# Altium footprint library Item_pcb.PcbLib: 282 footprints (part 16 of 18)
Each footprint in its own frame and in the unit in brackets; x right, y up, seen from the top. Pads: shape width x height; smd on the part's side, far side on the other; paste and mask are expansions set on the pad; w line width, h text height; cw(c..) or ccw(c..) is an arc to the next point about the centre after c.
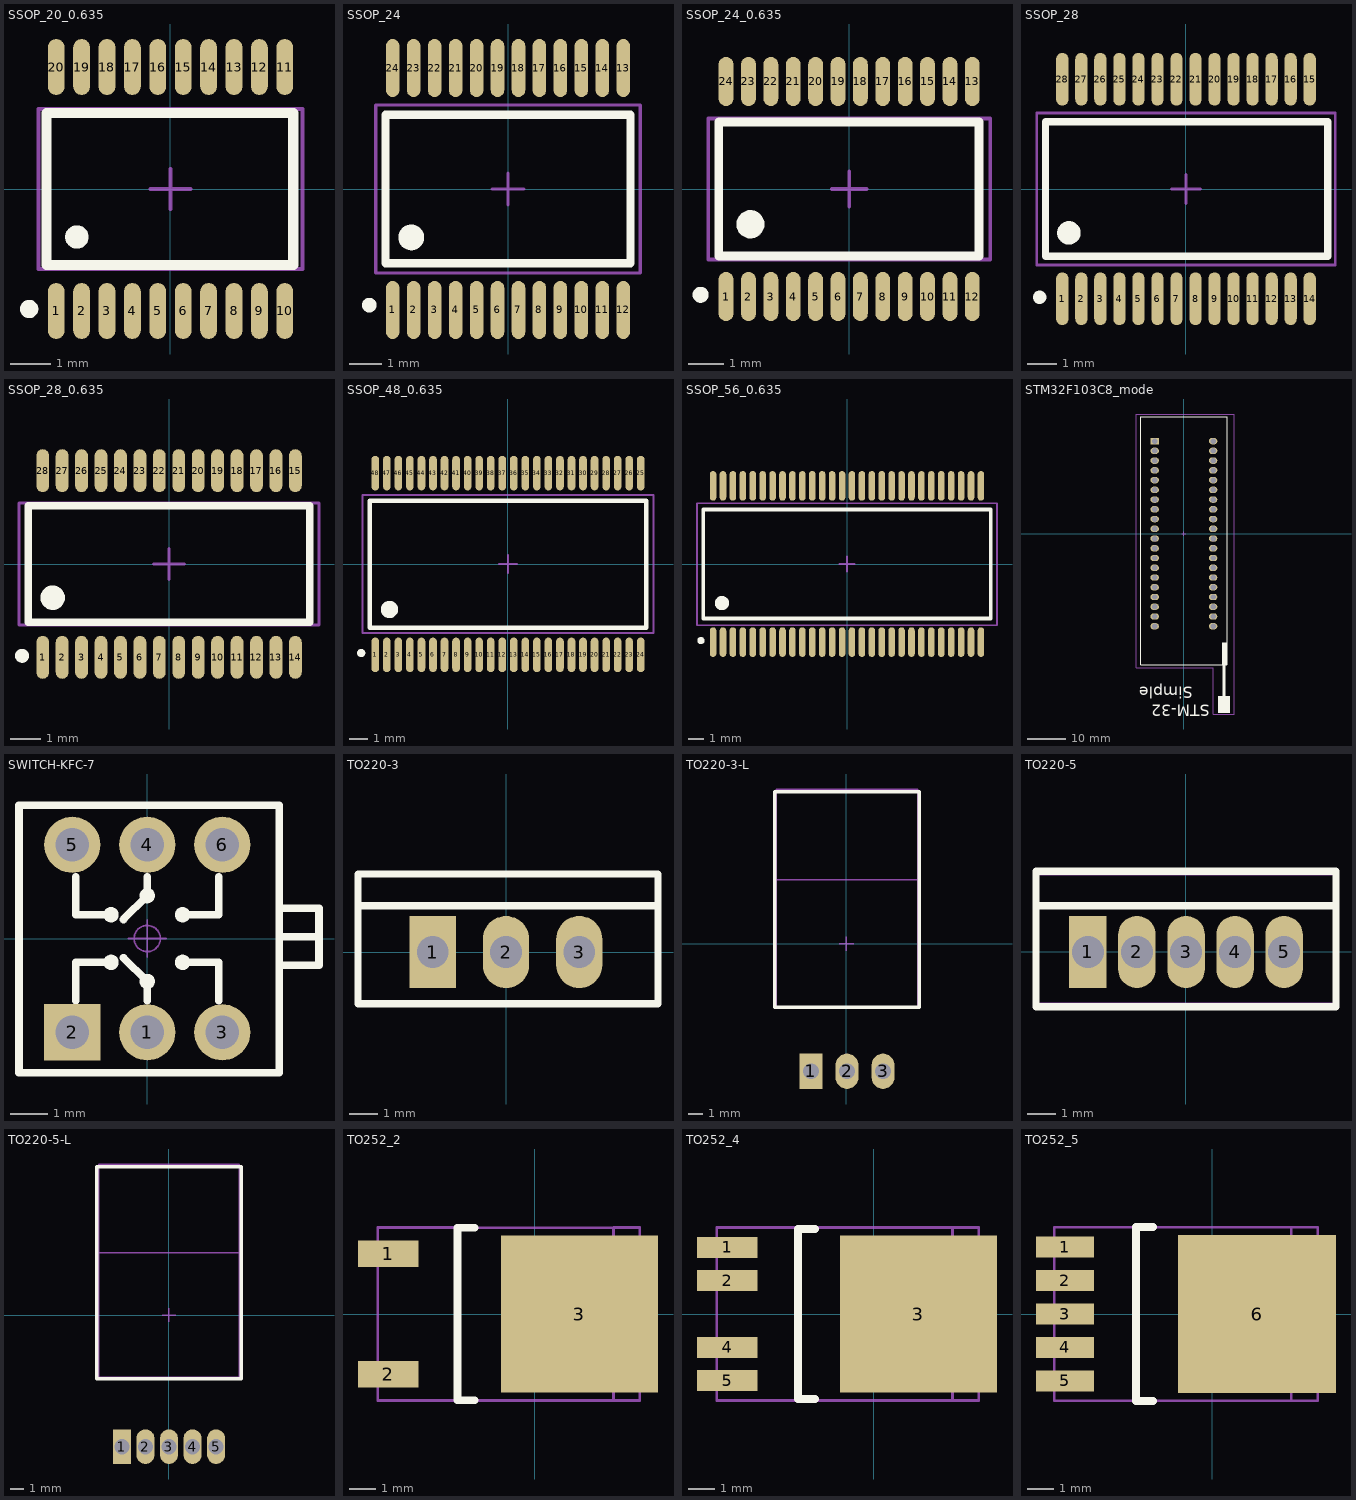
[diagram p15: the footprints below, top view; thin cyan lines are the x and y axes]

## SSOP_20_0.635 [mm]
pads (20):
  oval 0.42x1.4 smd: 1(-2.857,-3.05) 2(-2.222,-3.05) 3(-1.587,-3.05) 4(-0.953,-3.05) 5(-0.318,-3.05) 6(0.318,-3.05) 7(0.953,-3.05) 8(1.587,-3.05) 9(2.222,-3.05) 10(2.857,-3.05) 11(2.857,3.05) 12(2.222,3.05) 13(1.587,3.05) 14(0.953,3.05) 15(0.318,3.05) 16(-0.318,3.05) 17(-0.953,3.05) 18(-1.587,3.05) 19(-2.222,3.05) 20(-2.857,3.05)
Top Overlay:
  circle w0.254: c-3.532,-3 r0.1
  circle w0.3: c-2.341,-1.2 r0.141
  lines w0.254: -3.1,-1.9 -3.1,1.9 3.067,1.9 3.067,-1.9 -3.1,-1.9
Mechanical 15:
  lines w0.1: -0.5,0 0.5,0 ; 0,-0.5 0,0.5 ; -3.3,-2 -3.3,2 3.3,2 3.3,-2 -3.3,-2
3D body "TSSOP-20.STEP": height 1.2, standoff 0, extent -3.25,-3.2 3.25,3.2

## SSOP_24 [mm] "0.65"
pads (24):
  oval 0.42x1.8 smd: 1(-3.575,-3.75) 2(-2.925,-3.75) 3(-2.275,-3.75) 4(-1.625,-3.75) 5(-0.975,-3.75) 6(-0.325,-3.75) 7(0.325,-3.75) 8(0.975,-3.75) 9(1.625,-3.75) 10(2.275,-3.75) 11(2.925,-3.75) 12(3.575,-3.75) 13(3.575,3.75) 14(2.925,3.75) 15(2.275,3.75) 16(1.625,3.75) 17(0.975,3.75) 18(0.325,3.75) 19(-0.325,3.75) 20(-0.975,3.75) 21(-1.625,3.75) 22(-2.275,3.75) 23(-2.925,3.75) 24(-3.575,3.75)
Top Overlay:
  circle w0.4: c-3,-1.5 r0.2
  circle w0.254: c-4.3,-3.6 r0.1
  lines w0.254: -3.8,-2.3 -3.8,2.3 3.8,2.3 3.8,-2.3 -3.8,-2.3
Mechanical 15:
  lines w0.1: -0.5,0 0.5,0 ; 0,-0.5 0,0.5 ; -4.1,-2.6 -4.1,2.6 4.1,2.6 4.1,-2.6 -4.1,-2.6
3D body "SSOP-24.STEP": height 1.9, standoff 0, extent -4.1,-3.9 4.1,3.9

## SSOP_24_0.635 [mm]
pads (24):
  oval 0.42x1.4 smd: 1(-3.492,-3.05) 2(-2.857,-3.05) 3(-2.222,-3.05) 4(-1.587,-3.05) 5(-0.952,-3.05) 6(-0.317,-3.05) 7(0.318,-3.05) 8(0.953,-3.05) 9(1.588,-3.05) 10(2.223,-3.05) 11(2.858,-3.05) 12(3.493,-3.05) 13(3.493,3.05) 14(2.858,3.05) 15(2.223,3.05) 16(1.588,3.05) 17(0.953,3.05) 18(0.318,3.05) 19(-0.317,3.05) 20(-0.952,3.05) 21(-1.587,3.05) 22(-2.222,3.05) 23(-2.857,3.05) 24(-3.492,3.05)
Top Overlay:
  circle w0.4: c-2.8,-1 r0.2
  circle w0.254: c-4.217,-3 r0.1
  lines w0.254: -3.7,-1.9 3.683,-1.9 3.683,1.9 -3.7,1.9 -3.7,-1.9
Mechanical 15:
  lines w0.1: -0.5,0 0.5,0 ; 0,-0.5 0,0.5 ; -4,-2 4,-2 4,2 -4,2 -4,-2
3D body "TSSOP-24.STEP": height 1.2, standoff 0, extent -3.9,-3.2 3.9,3.2

## SSOP_28 [mm] "0.65"
pads (28):
  oval 0.42x1.8 smd: 1(-4.225,-3.75) 2(-3.575,-3.75) 3(-2.925,-3.75) 4(-2.275,-3.75) 5(-1.625,-3.75) 6(-0.975,-3.75) 7(-0.325,-3.75) 8(0.325,-3.75) 9(0.975,-3.75) 10(1.625,-3.75) 11(2.275,-3.75) 12(2.925,-3.75) 13(3.575,-3.75) 14(4.225,-3.75) 15(4.225,3.75) 16(3.575,3.75) 17(2.925,3.75) 18(2.275,3.75) 19(1.625,3.75) 20(0.975,3.75) 21(0.325,3.75) 22(-0.325,3.75) 23(-0.975,3.75) 24(-1.625,3.75) 25(-2.275,3.75) 26(-2.925,3.75) 27(-3.575,3.75) 28(-4.225,3.75)
Top Overlay:
  circle w0.4: c-4,-1.5 r0.2
  circle w0.254: c-5,-3.7 r0.1
  lines w0.254: -4.8,-2.3 -4.8,2.3 4.842,2.3 4.842,-2.3 -4.8,-2.3
Mechanical 15:
  lines w0.1: -0.5,0 0.5,0 ; 0,-0.5 0,0.5 ; -5.1,-2.6 -5.1,2.6 5.1,2.6 5.1,-2.6 -5.1,-2.6
3D body "User Library-SSOP-28-3.STEP": height 1.9, standoff 0, extent -5.1,-3.9 5.1,3.9

## SSOP_28_0.635 [mm]
pads (28):
  oval 0.42x1.4 smd: 1(-4.127,-3.05) 2(-3.492,-3.05) 3(-2.857,-3.05) 4(-2.222,-3.05) 5(-1.587,-3.05) 6(-0.953,-3.05) 7(-0.318,-3.05) 8(0.318,-3.05) 9(0.953,-3.05) 10(1.587,-3.05) 11(2.222,-3.05) 12(2.857,-3.05) 13(3.492,-3.05) 14(4.127,-3.05) 15(4.127,3.05) 16(3.492,3.05) 17(2.857,3.05) 18(2.222,3.05) 19(1.587,3.05) 20(0.953,3.05) 21(0.318,3.05) 22(-0.318,3.05) 23(-0.953,3.05) 24(-1.587,3.05) 25(-2.222,3.05) 26(-2.857,3.05) 27(-3.492,3.05) 28(-4.127,3.05)
Top Overlay:
  circle w0.254: c-4.802,-3 r0.1
  circle w0.4: c-3.8,-1.1 r0.2
  lines w0.254: -4.6,-1.9 -4.6,1.9 4.598,1.9 4.598,-1.9 -4.6,-1.9
Mechanical 15:
  lines w0.1: -0.5,0 0.5,0 ; 0,-0.5 0,0.5 ; -4.9,-2 -4.9,2 4.9,2 4.9,-2 -4.9,-2
3D body "TSSOP-28.STEP": height 1.2, standoff 0, extent -4.85,-3.2 4.85,3.2

## SSOP_48_0.635 [mm] "0.635"
pads (48):
  oval 0.42x1.9 smd: 1(-7.302,-5) 2(-6.667,-5) 3(-6.032,-5) 4(-5.397,-5) 5(-4.762,-5) 6(-4.127,-5) 7(-3.492,-5) 8(-2.857,-5) 9(-2.222,-5) 10(-1.587,-5) 11(-0.952,-5) 12(-0.317,-5) 13(0.318,-5) 14(0.953,-5) 15(1.588,-5) 16(2.223,-5) 17(2.858,-5) 18(3.493,-5) 19(4.128,-5) 20(4.763,-5) 21(5.398,-5) 22(6.033,-5) 23(6.668,-5) 24(7.303,-5) 25(7.303,5) 26(6.668,5) 27(6.033,5) 28(5.398,5) 29(4.763,5) 30(4.128,5) 31(3.493,5) 32(2.858,5) 33(2.223,5) 34(1.588,5) 35(0.953,5) 36(0.318,5) 37(-0.317,5) 38(-0.952,5) 39(-1.587,5) 40(-2.222,5) 41(-2.857,5) 42(-3.492,5) 43(-4.127,5) 44(-4.762,5) 45(-5.397,5) 46(-6.032,5) 47(-6.667,5) 48(-7.302,5)
Top Overlay:
  circle w0.5: c-6.524,-2.5 r0.224
  circle w0.254: c-8.077,-4.9 r0.1
  lines w0.254: -7.6,-3.5 -7.6,3.475 7.6,3.475 7.6,-3.5 -7.6,-3.5
Mechanical 15:
  lines w0.1: -0.5,0 0.5,0 ; 0,-0.5 0,0.5 ; -8,-3.8 -8,3.8 8,3.8 8,-3.8 -8,-3.8
3D body "User Library-SSOP-48.step": height 2.65, standoff 0, extent -8.002,-5.15 7.998,5.25

## SSOP_56_0.635 [mm] "0.635"
pads (56):
  oval 0.42x1.9 smd: 1(-8.572,-5) 2(-7.937,-5) 3(-7.302,-5) 4(-6.667,-5) 5(-6.032,-5) 6(-5.397,-5) 7(-4.762,-5) 8(-4.127,-5) 9(-3.492,-5) 10(-2.857,-5) 11(-2.222,-5) 12(-1.587,-5) 13(-0.952,-5) 14(-0.317,-5) 15(0.318,-5) 16(0.953,-5) 17(1.588,-5) 18(2.223,-5) 19(2.858,-5) 20(3.493,-5) 21(4.128,-5) 22(4.763,-5) 23(5.398,-5) 24(6.033,-5) 25(6.668,-5) 26(7.303,-5) 27(7.938,-5) 28(8.573,-5) 29(8.573,5) 30(7.938,5) 31(7.303,5) 32(6.668,5) 33(6.033,5) 34(5.398,5) 35(4.763,5) 36(4.128,5) 37(3.493,5) 38(2.858,5) 39(2.223,5) 40(1.588,5) 41(0.953,5) 42(0.318,5) 43(-0.317,5) 44(-0.952,5) 45(-1.587,5) 46(-2.222,5) 47(-2.857,5) 48(-3.492,5) 49(-4.127,5) 50(-4.762,5) 51(-5.397,5) 52(-6.032,5) 53(-6.667,5) 54(-7.302,5) 55(-7.937,5) 56(-8.572,5)
Top Overlay:
  circle w0.5: c-8,-2.5 r0.2
  circle w0.254: c-9.347,-4.9 r0.1
  lines w0.254: -9.2,-3.5 -9.2,3.475 9.2,3.475 9.2,-3.5 -9.2,-3.5
Mechanical 15:
  lines w0.1: -0.5,0 0.5,0 ; 0,-0.5 0,0.5 ; -9.6,-3.925 -9.6,3.875 9.6,3.875 9.6,-3.925 -9.6,-3.925
3D body "User Library-SSOP56_CY7C68013A.step": height 2.77, standoff 0, extent -9.272,-5.3 9.271,5.348

## STM32F103C8_mode [mm]
pads (40):
  rect 2.2x1.66 hole 1.4: 1(-7.62,24.13)
  oval 2.2x1.66 hole 1.4: 2(-7.62,21.59) 3(-7.62,19.05) 4(-7.62,16.51) 5(-7.62,13.97) 6(-7.62,11.43) 7(-7.62,8.89) 8(-7.62,6.35) 9(-7.62,3.81) 10(-7.62,1.27) 11(-7.62,-1.27) 12(-7.62,-3.81) 13(-7.62,-6.35) 14(-7.62,-8.89) 15(-7.62,-11.43) 16(-7.62,-13.97) 17(-7.62,-16.51) 18(-7.62,-19.05) 19(-7.62,-21.59) 20(-7.62,-24.13) 21(7.62,-24.13) 22(7.62,-21.59) 23(7.62,-19.05) 24(7.62,-16.51) 25(7.62,-13.97) 26(7.62,-11.43) 27(7.62,-8.89) 28(7.62,-6.35) 29(7.62,-3.81) 30(7.62,-1.27) 31(7.62,1.27) 32(7.62,3.81) 33(7.62,6.35) 34(7.62,8.89) 35(7.62,11.43) 36(7.62,13.97) 37(7.62,16.51) 38(7.62,19.05) 39(7.62,21.59) 40(7.62,24.13)
Top Overlay:
  region: 8.849,-42.278 8.849,-46.678 12.049,-46.678 12.049,-42.278
  region: 9.949,-28.378 9.949,-34.178 11.249,-34.178 11.249,-28.378
  lines w0.254: 11.224,-34.225 -11.2,-34.225 -11.2,30.422 11.249,30.422 11.249,-34.2
  lines w0.8: 10.449,-44.178 10.449,-34.225
  text "Simple" at 2.249,-38.801 h5
  text "STM-32" at 6.768,-43.512 h5
Mechanical 15:
  lines w0.1: -0.5,0 0.5,0 ; 0,-0.5 0,0.5 ; -12.4,-34.9 -12.4,31.2 13.1,31.2 13.1,-47 7.6,-47 7.6,-34.9 -12.4,-34.9
3D body "HEADER 2.54X20.stp": height -7.8, standoff -19, extent 6.371,-25.527 8.869,25.273
3D body "stm32.step": height 25.5, standoff 13, extent -11.43,-26.745 11.43,28.015
3D body "HEADER 2.54X20.stp": height -7.8, standoff -19, extent -8.869,-25.527 -6.371,25.273
3D body "ZIF-40.STEP": height 12, standoff -4, extent -11.584,-46.769 12.282,30.422

## SWITCH-KFC-7 [mm] "自锁开关，规格：7*7mm"
pads (6):
  round 1.5 hole 0.9: 1(0,-2.5) 3(2,-2.5) 4(0,2.5) 5(-2,2.5) 6(2,2.5)
  rect 1.5x1.5 hole 0.9: 2(-2,-2.5)
Top Overlay:
  circle w0.254: c0.94,0.635 r0.076
  circle w0.254: c-0.965,0.635 r0.076
  circle w0.254: c0,1.143 r0.076
  circle w0.254: c0,-1.143 r0.076
  circle w0.254: c-0.965,-0.635 r0.076
  circle w0.254: c0.94,-0.635 r0.076
  lines w0.203: -1.905,-1.651 -1.905,-0.635 -0.889,-0.635 ; -1.905,1.651 -1.905,0.635 -0.889,0.635 ; -0.635,-0.508 0,-1.143 0,-1.651 ; -0.635,0.508 0,1.143 0,1.651 ; 1.016,-0.635 1.905,-0.635 1.905,-1.651 ; 1.016,0.635 1.905,0.635 1.905,1.651 ; 3.514,0.05 4.579,0.05 ; 3.563,-0.712 4.579,-0.712 4.579,0.812 3.563,0.812 ; -3.42,-3.581 -3.42,3.556 3.514,3.556 3.514,2.54 3.514,-3.581 -3.42,-3.581
Mechanical 15:
  circle w0.05: c0,0 r0.35
  lines w0.05: -0.5,0 0.5,0 ; 0,-0.5 0,0.5
3D body "SLSW 7x7.STEP": height 11.2, standoff -3.2, extent -3.5,-3.5 3.5,3.5

## TO220-3 [mm]
pads (3):
  rect 1.6x2.5 hole 1.1: 1(-2.54,0)
  oval 1.6x2.5 hole 1.1: 2(0,0) 3(2.54,0)
Top Overlay:
  lines w0.254: -5.132,1.606 5.268,1.606 ; -5.132,-1.794 5.268,-1.794 5.268,2.706 -5.132,2.706 -5.132,-1.794
Mechanical 15:
  lines w0.1: -5.132,-1.8 -5.132,2.7 5.268,2.7 5.268,-1.8 -5.132,-1.8
3D body "TO-220-3-1.step": height 18.5, standoff -9.9, extent -5.132,-1.794 5.268,2.706

## TO220-3-L [mm]
pads (3):
  rect 1.6x2.5 hole 1.1: 1(-2.5,-9)
  oval 1.6x2.5 hole 1.1: 2(0.04,-9) 3(2.58,-9)
Top Overlay:
  lines w0.254: -5.06,-4.5 -5.06,10.7 5.14,10.7 5.14,-4.5 -5.06,-4.5
Mechanical 15:
  lines w0.1: -4.96,4.5 5.04,4.5 ; -0.5,0 0.5,0 ; 0,-0.5 0,0.5 ; -4.96,-4.5 5.04,-4.5 5.04,10.9 -4.96,10.9 -4.96,-4.5
3D body "TO-220-3-2.step": height 4.5, standoff -3, extent -4.965,-9.24 5.035,10.464

## TO220-5 [mm]
pads (5):
  rect 1.3x2.5 hole 1.1: 1(-3.4,0)
  oval 1.3x2.5 hole 1.1: 2(-1.7,0) 3(0,0) 4(1.7,0) 5(3.4,0)
Top Overlay:
  lines w0.254: -5.2,1.6 5.2,1.6 ; -5.2,-1.9 -5.2,2.8 5.2,2.8 5.2,-1.9 -5.2,-1.9
Mechanical 15:
  lines w0.1: -5.2,-1.8 -5.2,2.7 5.2,2.7 5.2,-1.8 -5.2,-1.8
3D body "TO-220-5H.STEP": height 19.06, standoff -9.87, extent -5.081,-1.8 5.081,2.721

## TO220-5-L [mm]
pads (5):
  rect 1.3x2.5 hole 1.1: 1(-3.4,-9.5)
  oval 1.3x2.5 hole 1.1: 2(-1.7,-9.5) 3(0,-9.5) 4(1.7,-9.5) 5(3.4,-9.5)
Top Overlay:
  lines w0.254: -5.2,-4.6 5.2,-4.6 5.2,10.7 -5.2,10.7 -5.2,-4.6
Mechanical 15:
  lines w0.1: -5.081,4.5 5.081,4.5 ; -0.5,0 0.5,0 ; 0,-0.5 0,0.5 ; -5.081,-4.5 -5.081,10.9 5.081,10.9 5.081,-4.5 -5.081,-4.5
3D body "TO-220-5.STEP": height 4.56, standoff -5.94, extent -5.081,-9.7 5.081,10.468

## TO252_2 [mm]
pads (3):
  rect 2.3x1 smd: 1(-5.6,2.3) 2(-5.6,-2.3)
  rect 6x6 smd: 3(1.7,0)
Top Overlay:
  lines w0.3: -2.294,-3.29 -2.95,-3.29 -2.95,3.29 -2.294,3.29
Mechanical 15:
  lines w0.1: -3,3.29 3,3.29 ; -3,-3.3 -3,3.3 -6,3.3 -6,-3.3 -3,-3.3 ; -3,-3.3 3,-3.3 ; 3,-3.3 3,3.3 4,3.3 4,-3.3 3,-3.3
3D body "TO252AA.STEP": height 2.3, standoff -0.01, extent -5.5,-3.29 4.2,3.29

## TO252_4 [mm]
pads (5):
  rect 2.3x0.8 smd: 1(-5.6,2.54) 2(-5.6,1.27) 4(-5.6,-1.27) 5(-5.6,-2.54)
  rect 6x6 smd: 3(1.7,0)
Top Overlay:
  lines w0.3: -2.25,-3.25 -2.9,-3.25 -2.9,3.25 -2.25,3.25
Mechanical 15:
  lines w0.1: -3,-3.3 -6,-3.3 -6,3.3 -3,3.3 ; -3,-3.3 -3,3.3 ; -3,-3.3 3,-3.3 ; -3,3.3 3,3.3 ; 3,-3.3 3,3.3 ; 3,-3.3 4,-3.3 4,3.3 3,3.3
3D body "TO-252-4L.STEP": height 2.3, standoff -0.01, extent -5.7,-3.249 4.1,3.251

## TO252_5 [mm]
pads (6):
  rect 2.2x0.8 smd: 1(-5.6,2.54) 2(-5.6,1.27) 3(-5.6,0) 4(-5.6,-1.27) 5(-5.6,-2.54)
  rect 6x6 smd: 6(1.7,0)
Top Overlay:
  lines w0.3: -2.25,-3.3 -2.9,-3.3 -2.9,3.3 -2.25,3.3
Mechanical 15:
  lines w0.1: -3,-3.3 3,-3.3 ; -3,-3.3 -3,3.3 ; -3,-3.3 -6,-3.3 -6,3.3 -3,3.3 ; -3,3.3 3,3.3 ; 3,-3.3 3,3.3 ; 3,-3.3 4,-3.3 4,3.3 3,3.3
3D body "TO-252-5.step": height 2.4, standoff -0.01, extent -6.333,-3.353 4.533,3.347